# Altium footprint library PcbLib.PcbLib: 35 footprints (part 1 of 3)
Each footprint in its own frame and in the unit in brackets; x right, y up, seen from the top. Pads: shape width x height; smd on the part's side, far side on the other; paste and mask are expansions set on the pad; w line width, h text height; cw(c..) or ccw(c..) is an arc to the next point about the centre after c.
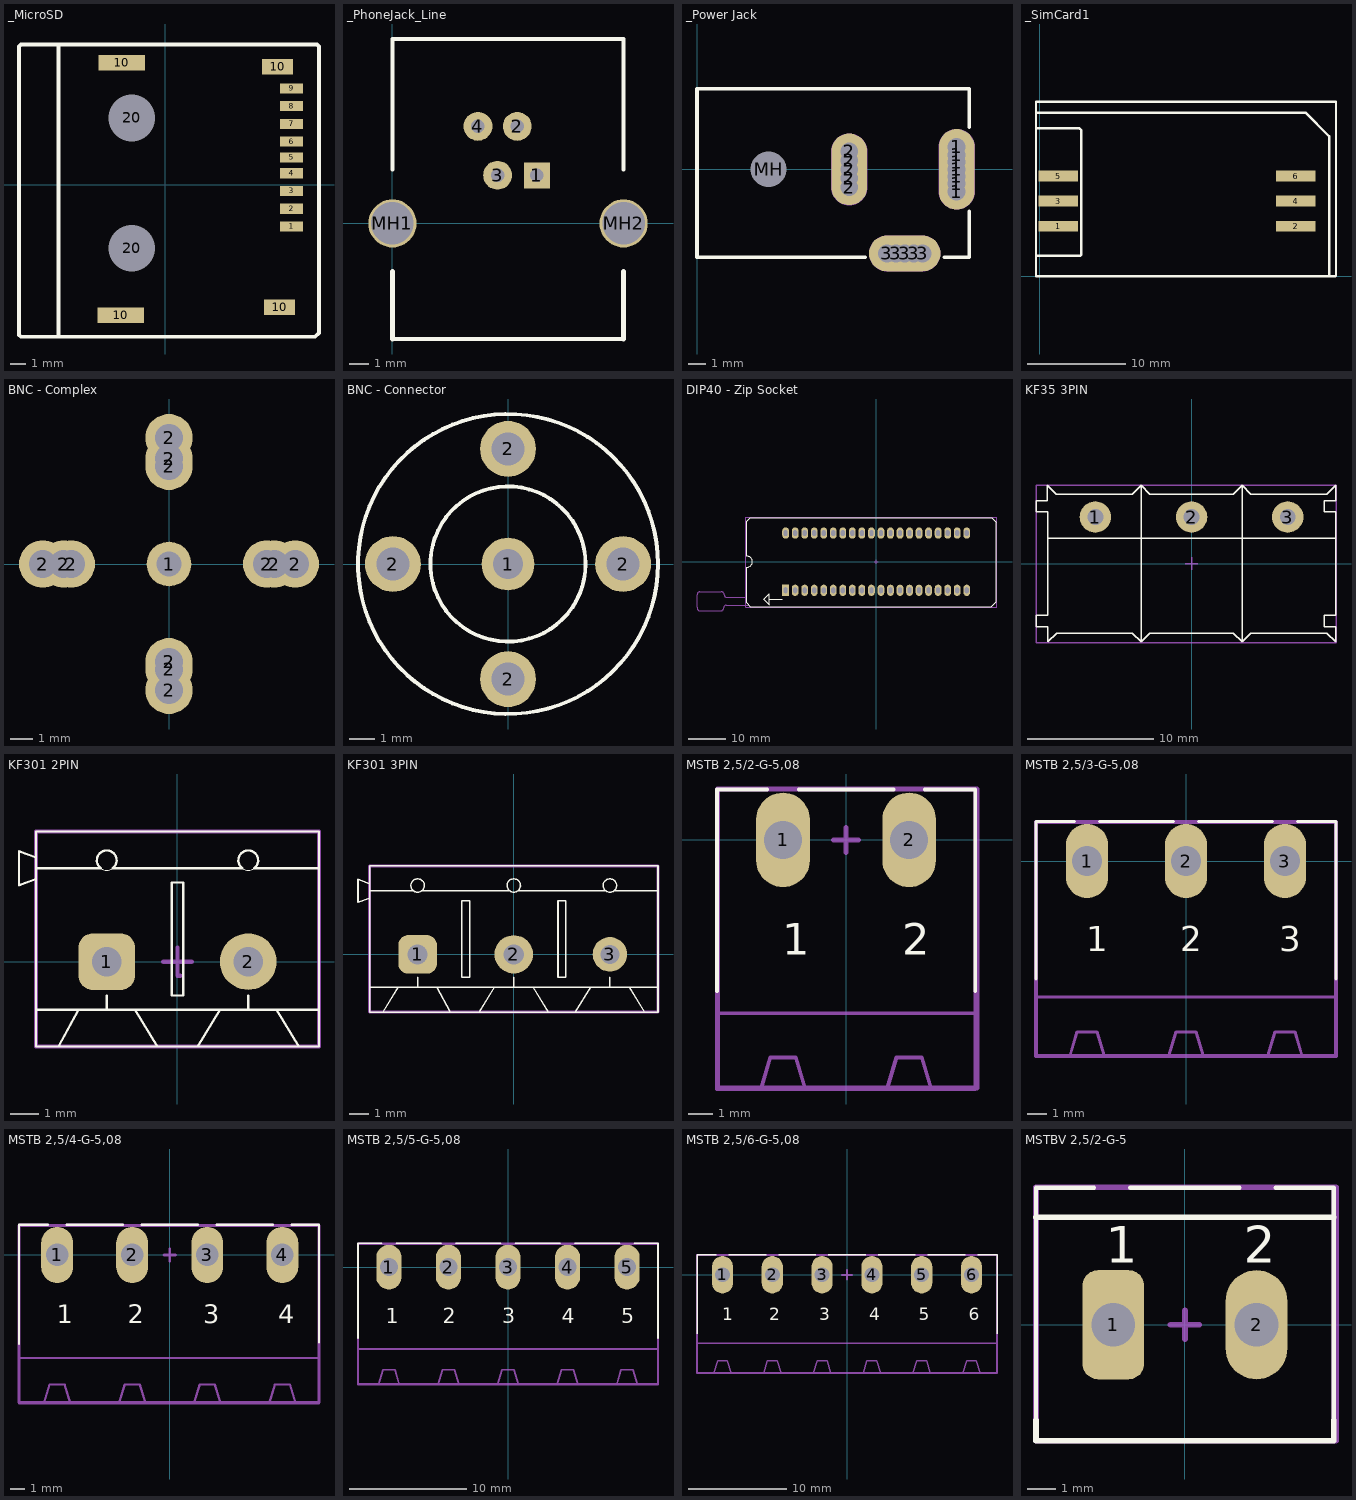
[diagram p0: the footprints below, top view; thin cyan lines are the x and y axes]

## _MicroSD [mm]
pads (15):
  rect 1.5x0.65 smd: 1(8.139,-2.684) 2(8.139,-1.541) 3(8.139,-0.398) 4(8.139,0.745) 5(8.139,1.761) 6(8.139,2.777) 7(8.139,3.92) 8(8.139,5.063) 9(8.139,6.206)
  rect 3x1 smd: 10(-2.846,-8.399) 10(-2.794,7.857)
  rect 2x1 smd: 10(7.239,7.603) 10(7.366,-7.891)
  round 1.524 hole 3: 20(-2.148,-4.081) 20(-2.148,4.301)
Top Overlay:
  lines w0.25: -6.858,-9.779 -6.858,8.89
  lines w0.254: -9.398,-9.652 -9.398,8.89 -9.271,9.017 9.779,9.017 9.906,8.89 9.906,-9.525 9.652,-9.779 9.525,-9.779 -9.271,-9.779 -9.398,-9.652

## _PhoneJack_Line [mm]
pads (6):
  rect 1.35x1.35 hole 0.7: 1(7.5,2.5)
  round 1.5 hole 0.7: 2(6.48,5.04) 3(5.46,2.5) 4(4.44,5.04)
  round 2.5 hole 2.2 unplated: MH1(0,0) MH2(12,0)
Top Overlay:
  lines w0.2: 0,-6 12,-6 ; 0,2.796 0,9.573 12,9.573 12,2.796
  lines w0.25: 0,-6 0,-2.5 ; 12,-6 12,-2.5

## _Power Jack [mm] "Power Adaptor Jack"
pads (18):
  round 1.5 hole 1: 1(14.5,-1.25) 1(14.5,-0.8) 1(14.5,-0.4) 1(14.5,0.4) 1(14.5,0.8) 1(14.5,1.25) 2(8.5,-1) 2(8.5,1) 2(8.5,-0.5) 2(8.5,0.5) 3(10.6,-4.7) 3(11.1,-4.7) 3(12.1,-4.7) 3(12.6,-4.7)
  oval 2x4.5 hole 1: 1(14.5,0)
  oval 2x4 hole 1: 2(8.5,0)
  oval 4x2 hole 1: 3(11.6,-4.7)
  round 1.9 hole 2: MH(4,0)
Top Overlay:
  lines w0.2: 9.4,-4.9 0,-4.9 0,4.5 15.2,4.5 15.2,2.35 ; 13.8,-4.9 15.2,-4.9 15.2,-2.35
Mechanical 1:
  lines w1: 8.5,-1 8.5,1 ; 10.6,-4.7 12.6,-4.7 ; 14.5,-1.25 14.5,1.25
Mechanical 2:
  lines w2.016: 8.5,-1 8.5,1 ; 10.6,-4.7 12.6,-4.7 ; 14.5,-1.25 14.5,1.25

## _SimCard1 [mm]
pads (6):
  rect 4x1.1 smd: 1(1.84,5.08) 2(25.9,5.08) 3(1.84,7.62) 4(25.9,7.62) 5(1.84,10.16) 6(25.9,10.16)
Top Overlay:
  lines w0.25: -0.3,15 2.6,15 4,15 4.2,14.8 4.2,2.2 4.1,2.1 2,2.1 ; -0.3,16.6 26.9,16.6 29.3,14.2 29.3,0 ; -0.2,2.1 2.8,2.1 ; -0.4,0 -0.4,17.7 30,17.7 30,0.1 29.9,0 -0.4,0

## BNC - Complex [mil]
pads (13):
  round 80 hole 45: 1(0,0)
  round 85 hole 50: 2(-226.38,0) 2(-188.98,0) 2(-175.2,0) 2(0,-226.38) 2(0,-188.98) 2(0,-175.2) 2(0,175.2) 2(0,188.98) 2(0,226.38) 2(175.2,0) 2(188.98,0) 2(226.38,0)
3D body "BNC_complex.STEP": height 1369.68, standoff -173.23, extent -278,-278.21 278,278.2

## BNC - Connector [mil]
pads (5):
  round 80 hole 45: 1(0,0)
  round 85 hole 50: 2(-175.2,0) 2(0,-175.2) 2(0,175.2) 2(175.2,0)
Top Overlay:
  circle w5.91: c0,0 r118.11
  circle w5.91: c0,0 r228.35
3D body "My BNC Short.STEP": height 538.19, standoff -173.23, extent -218.11,-218.11 218.11,218.11

## DIP40 - Zip Socket [mm] "40 Pin Zip Socket DESIGNER : ABBAS BASEREH"
height 12
pads (40):
  rect 1.8x3 hole 1 slot 1.5 at 90 deg mask+0.06: 1(-24.13,-7.62)
  oval 1.8x3 hole 1 slot 1.5 at 90 deg mask+0.06: 2(-21.59,-7.62) 3(-19.05,-7.62) 4(-16.51,-7.62) 5(-13.97,-7.62) 6(-11.43,-7.62) 7(-8.89,-7.62) 8(-6.35,-7.62) 9(-3.81,-7.62) 10(-1.27,-7.62) 11(1.27,-7.62) 12(3.81,-7.62) 13(6.35,-7.62) 14(8.89,-7.62) 15(11.43,-7.62) 16(13.97,-7.62) 17(16.51,-7.62) 18(19.05,-7.62) 19(21.59,-7.62) 20(24.13,-7.62) 21(24.13,7.62) 22(21.59,7.62) 23(19.05,7.62) 24(16.51,7.62) 25(13.97,7.62) 26(11.43,7.62) 27(8.89,7.62) 28(6.35,7.62) 29(3.81,7.62) 30(1.27,7.62) 31(-1.27,7.62) 32(-3.81,7.62) 33(-6.35,7.62) 34(-8.89,7.62) 35(-11.43,7.62) 36(-13.97,7.62) 37(-16.51,7.62) 38(-19.05,7.62) 39(-21.59,7.62) 40(-24.13,7.62)
Top Overlay:
  lines w0.2: -28.5,-10 -25,-10 ; -34.5,-10.992 -34.5,-1.5 ccw(c-34.5,0) -34.5,1.5 -34.5,10.778 -33.578,11.7 30.808,11.7 32,10.508 32,-10.722 30.722,-12 -33.492,-12 -34.5,-10.992 ; -30,-10 -28.5,-11.5 -28.5,-8.5 -30,-10
Mechanical 13:
  lines w0.2: -34.5,-9.5 -39.795,-9.5 cw(c-39.795,-8.808) -40.488,-8.808 ccw(c-41.269,-8.808) -41.269,-8.026 -46.965,-8.026 ccw(c-46.965,-8.808) -47.746,-8.808 -47.746,-12.198 ccw(c-46.812,-12.198) -46.812,-13.132 -41.478,-13.132 ccw(c-41.478,-12.243) -40.589,-12.243 cw(c-39.903,-12.243) -39.903,-11.557 -34.135,-11.557
Mechanical 15:
  lines w0.2: -0.5,0 0.5,0 ; 0,-0.5 0,0.5 ; -34.7,-12.2 -34.7,11.9 32.2,11.9 32.2,-12.2 -34.7,-12.2
3D body "Zif-Zip Socket.STEP": height 21.95, standoff -2.53, extent -41.579,-12.975 31.475,11.501

## KF35 3PIN [mm] "Designer Abbas Basereh"
height 12.5
pads (3):
  round 2.5 hole 1.25: 1(-7.62,3.7) 2(0,3.7) 3(7.62,3.7)
Top Overlay:
  lines w0.1: -11.4,2 11.4,2 ; -4,-6.2 -4,6.2 ; -4,-6.2 -3.3,-5.5 3.3,-5.5 4,-6.2 ; -4,-6.2 -4.7,-5.5 -10.7,-5.5 -11.4,-6.2 -11.4,-5 -12.3,-5 -12.3,-4.1 -11.4,-4.1 -11.4,4.1 -11.43,4.1 -12.33,4.1 -12.33,5 -11.43,5 -11.43,6.2 -10.73,5.5 -4.7,5.5 -4,6.2 ; -4,6.2 -3.3,5.5 3.3,5.5 4,6.2 ; 4,-6.2 4,6.2 ; 4,-6.2 4.7,-5.5 10.73,-5.5 11.43,-6.2 11.43,-5 10.53,-5 10.53,-4.1 11.43,-4.1 11.43,4.1 10.53,4.1 10.53,5 11.43,5 11.43,6.2 10.73,5.5 4.7,5.5 4,6.2
Mechanical 15:
  lines w0.1: -0.5,0 0.5,0 ; 0,-0.5 0,0.5 ; -12.3,-6.275 -12.3,6.225 11.45,6.225 11.45,-6.275 -12.3,-6.275

## KF301 2PIN [mm] "Designer Abbas Basereh"
height 7.5
pads (2):
  rrect50% 2x2 hole 1.05: 1(-2.5,0)
  round 2 hole 1.05: 2(2.5,0)
Top Overlay:
  lines w0.013: -2.71,3.3 ccw(c-2.5,3.58) -2.29,3.3 ; 2.29,3.3 ccw(c2.5,3.58) 2.71,3.3
  lines w0.08: -4.2,-3 -3.5,-1.7 -1.5,-1.7 -0.7,-3 ; -2.5,-1.7 -2.5,-1.2 ; 0.7,-3 1.5,-1.7 3.5,-1.7 4.3,-3 ; 2.5,-1.7 2.5,-1.2 ; -5.6,2.7 -5,2.918 ; -5.6,2.7 -5.6,3.9 ; -5.6,2.7 -5,2.918 ; -5.6,2.7 -5.6,3.9 ; -5.6,3.9 -5,3.682 ; -5.6,3.9 -5,3.682 ; -5,-3 -5,-1.7 ; -5,-3 5,-3 ; -5,-3 5,-3 ; -5,-3 -5,2.918 ; -5,-1.7 -5,3.3 ; -5,-1.7 5,-1.7 ; -5,3.3 -5,4.6 ; -5,3.3 -2.71,3.3 cw(c-2.5,3.58) -2.29,3.3 2.29,3.3 cw(c2.5,3.58) 2.71,3.3 5,3.3 ; -5,3.682 -5,4.6 ; -5,4.6 5,4.6 ; -5,4.6 5,4.6 ; 5,-3 5,-1.7 ; 5,-3 5,4.6 ; 5,-1.7 5,3.3 ; 5,3.3 5,4.6 ; -0.2,-1.2 -0.2,2.8 0.2,2.8 0.2,-1.2 -0.2,-1.2
Mechanical 15:
  lines w0.15: -0.5,0 0.5,0 ; 0,0.5 0,-0.5 0.1,-0.5 ; -5,-3 5,-3 5,4.6 -5,4.6 -5,-3
3D body "User Library-Terminal-Screw-3A-2way.STEP": height 10, standoff -3, extent -5.6,-3 5,4.6

## KF301 3PIN [mm] "Designer Abbas Basereh"
height 7.5
pads (3):
  rrect50% 2x2 hole 1.05: 1(-5,0)
  round 2 hole 1.05: 2(0,0)
  round 1.8 hole 1: 3(5,0)
Top Overlay:
  lines w0.08: -6.8,-3 -6,-1.7 -4,-1.7 -3.3,-3 ; -5,-1.7 -5,-1.2 ; -1.8,-3 -1,-1.7 1,-1.7 1.8,-3 ; 0,-1.7 0,-1.2 ; 3.2,-3 4,-1.7 6,-1.7 6.8,-3 ; 5,-1.7 5,-1.2 ; -8.1,2.7 -7.5,2.918 ; -8.1,2.7 -8.1,3.9 ; -8.1,2.7 -8.1,3.9 ; -8.1,2.7 -7.5,2.918 ; -8.1,3.9 -7.5,3.681 ; -8.1,3.9 -7.5,3.681 ; -7.5,-3 7.5,-3 ; -7.5,-3 -7.5,2.918 ; -7.5,-3 7.5,-3 ; -7.5,-3 -7.5,-1.7 ; -7.5,-1.7 7.5,-1.7 ; -7.5,-1.7 -7.5,3.3 ; -7.5,3.3 -5.21,3.3 ; -7.5,3.3 -7.5,4.6 ; -7.5,3.681 -7.5,4.6 ; -7.5,4.6 7.5,4.6 ; -7.5,4.6 7.5,4.6 ; -5.21,3.3 cw(c-5,3.58) -4.79,3.3 ; -5.21,3.3 ccw(c-5,3.58) -4.79,3.3 ; -4.79,3.3 -0.21,3.3 ; -0.21,3.3 cw(c0,3.58) 0.21,3.3 ; -0.21,3.3 ccw(c0,3.58) 0.21,3.3 ; 0.21,3.3 4.79,3.3 ; 4.79,3.3 cw(c5,3.58) 5.21,3.3 ; 4.79,3.3 ccw(c5,3.58) 5.21,3.3 ; 5.21,3.3 7.5,3.3 ; 7.5,-3 7.5,4.6 ; 7.5,-3 7.5,-1.7 ; 7.5,-1.7 7.5,3.3 ; 7.5,3.3 7.5,4.6 ; -2.7,-1.2 -2.7,2.8 -2.3,2.8 -2.3,-1.2 -2.7,-1.2 ; 2.3,-1.2 2.7,-1.2 2.7,2.8 2.3,2.8 2.3,-1.2
Mechanical 15:
  lines w0.15: -7.5,-3 -7.5,4.6 7.5,4.6 7.5,-3 -7.5,-3
3D body "User Library-Terminal-Screw-3A-3way.STEP": height 10, standoff -3, extent -8.1,-3 7.5,4.6

## MSTB 2,5/2-G-5,08 [mil] "Header, Nominal current: 12 A Rated voltage (III/2): 320 V Number of positions: 2 Pitch: 5.08 mm Color: green Contact surface: Tin Assembly: Soldering DESIGNER:ABBAS BASEREH"
height 338.58
pads (2):
  oval 85x150 hole 60: 1(-100,0) 2(100,0)
Top Overlay:
  lines w6: -204.72,-239.72 -204.72,80 -125,80 ; -75,80 75,80 ; 125,80 204.72,80 204.72,-239.72
  text "2" at 88.74,-182.48 h50
  text "1" at -101.26,-182.48 h50
Mechanical 13:
  lines w6: -204.72,-275 204.72,-275 ; -125,80 -204.72,80 -204.72,-239.72 -204.72,-395 -135,-395 ; -75,80 75,80 ; 125,80 204.72,80 204.72,-239.72 204.72,-395 135,-395 ; -135,-395 -65,-395 ; -135,-395 -120,-345 -80,-345 -65,-395 ; -65,-395 65,-395 ; 65,-395 135,-395 ; 65,-395 80,-345 120,-345 135,-395
Mechanical 15:
  lines w7.87: -19.68,0 19.68,0 ; 0,-19.68 0,19.68 ; -203.74,-393.7 -203.74,80.71 207.68,80.71 207.68,-393.7 -203.74,-393.7
3D body "User Library-MSTB 2,5-2-G-5,08 1770711.STEP": height 339.58, standoff -136.8, extent -199.21,-393.75 200.79,78.79

## MSTB 2,5/3-G-5,08 [mil] "Header, Nominal current: 12 A Rated voltage (III/2): 320 V Number of positions: 3 Pitch: 5.08 mm Color: green Contact surface: Tin Assembly: Soldering  DESIGNER:ABBAS BASEREH"
height 338.58
pads (3):
  oval 85x150 hole 60: 1(-200,0) 2(0,0) 3(200,0)
Top Overlay:
  lines w6: -303.15,-238.15 -303.15,80 -225,80 ; -175,80 -25,80 ; 25,80 175,80 ; 225,80 303.15,80 303.15,-238.15
  text "1" at -201.26,-182.48 h50
  text "2" at -11.26,-182.48 h50
  text "3" at 188.74,-182.48 h50
Mechanical 13:
  lines w6: -303.15,-275 303.15,-275 ; -225,80 -303.15,80 -303.15,-238.15 -303.15,-395 -235,-395 ; -175,80 -25,80 ; 25,80 175,80 ; 225,80 303.15,80 303.15,-238.15 303.15,-395 235,-395 ; -235,-395 -220,-345 -180,-345 -165,-395 ; -235,-395 -165,-395 ; -165,-395 -35,-395 ; -35,-395 -20,-345 20,-345 35,-395 ; -35,-395 35,-395 ; 35,-395 165,-395 ; 165,-395 235,-395 ; 165,-395 180,-345 220,-345 235,-395
Mechanical 15:
  lines w7.87: -303.15,-393.7 -303.15,78.74 303.15,78.74 303.15,-393.7 -303.15,-393.7
3D body "User Library-MSTB 2,5-3-G-5,08 1759020.STEP": height 339.58, standoff -136.8, extent -300,-393.79 300,78.74

## MSTB 2,5/4-G-5,08 [mil] "Header, Nominal current: 12 A Rated voltage (III/2): 320 V Number of positions: 4 Pitch: 5,08 mm Color: green Contact surface: Tin Assembly: Soldering  DESIGNER ABBAS BASEREH"
height 338.58
pads (4):
  oval 85x150 hole 60: 1(-300,0) 2(-100,0) 3(100,0) 4(300,0)
Top Overlay:
  lines w6: -401.57,-236.57 -401.57,80 -325,80 ; -275,80 -125,80 ; -75,80 75,80 ; 125,80 275,80 ; 325,80 397.64,80 397.64,-232.64
  text "4" at 288.74,-182.48 h50
  text "3" at 88.74,-182.48 h50
  text "2" at -111.26,-182.48 h50
  text "1" at -301.26,-182.48 h50
Mechanical 13:
  lines w6: -397.64,-275 397.64,-275 ; -325,80 -401.57,80 -401.57,-236.57 -401.57,-395 -335,-395 ; -275,80 -125,80 ; -75,80 75,80 ; 125,80 275,80 ; 325,80 397.64,80 397.64,-232.64 397.64,-395 335,-395 ; -335,-395 -265,-395 ; -335,-395 -320,-345 -280,-345 -265,-395 ; -265,-395 -135,-395 ; -135,-395 -65,-395 ; -135,-395 -120,-345 -80,-345 -65,-395 ; -65,-395 65,-395 ; 65,-395 80,-345 120,-345 135,-395 ; 65,-395 135,-395 ; 135,-395 265,-395 ; 265,-395 280,-345 320,-345 335,-395 ; 265,-395 335,-395
Mechanical 15:
  lines w7.87: -15.75,0 15.75,0 ; 0,-15.75 0,15.75 ; -401.57,-393.7 397.64,-393.7 397.64,78.74 -401.57,78.74 -401.57,-393.7
3D body "User Library-MSTB 2,5-4-G-5,08 1759033.STEP": height 338.58, standoff -137.8, extent -400,-393.79 400,78.74

## MSTB 2,5/5-G-5,08 [mil] "Header, Nominal current: 12 A Rated voltage (III/2): 320 V Number of positions: 5 Pitch: 5,08 mm Color: green Contact surface: Tin Assembly: Soldering  DESIGNER ABBAS BASEREH"
height 338.58
pads (5):
  oval 85x150 hole 60: 1(-400,0) 2(-200,0) 3(0,0) 4(200,0) 5(400,0)
Top Overlay:
  lines w6: -503.94,-238.94 -503.94,80 -425,80 ; -375,80 -225,80 ; -175,80 -25,80 ; 25,80 175,80 ; 225,80 375,80 ; 425,80 503.94,80 503.94,-238.94
  text "1" at -410,-189.37 h50
  text "2" at -220,-189.37 h50
  text "3" at -20,-189.37 h50
  text "4" at 180,-189.37 h50
  text "5" at 380,-189.37 h50
Mechanical 13:
  lines w6: -503.94,-275 503.94,-275 ; -425,80 -503.94,80 -503.94,-238.94 -503.94,-395 -435,-395 ; -375,80 -225,80 ; -175,80 -25,80 ; 25,80 175,80 ; 225,80 375,80 ; 425,80 503.94,80 503.94,-238.94 503.94,-395 435,-395 ; -435,-395 -365,-395 ; -435,-395 -420,-345 -380,-345 -365,-395 ; -365,-395 -235,-395 ; -235,-395 -165,-395 ; -235,-395 -220,-345 -180,-345 -165,-395 ; -165,-395 -35,-395 ; -35,-395 -20,-345 20,-345 35,-395 ; -35,-395 35,-395 ; 35,-395 165,-395 ; 165,-395 180,-345 220,-345 235,-395 ; 165,-395 235,-395 ; 235,-395 365,-395 ; 365,-395 380,-345 420,-345 435,-395 ; 365,-395 435,-395
Mechanical 15:
  lines w7.87: -503.94,-393.7 -503.94,78.74 503.94,78.74 503.94,-393.7 -503.94,-393.7
3D body "User Library-MSTB 2,5-5-G-5,08 1759046.STEP": height 338.58, standoff -137.8, extent -500,-393.79 500,78.74

## MSTB 2,5/6-G-5,08 [mil] "Header, Nominal current: 12 A Rated voltage (III/2): 320 V Number of positions: 6 Pitch: 5,08 mm Color: green Contact surface: Tin Assembly: Soldering  DESIGNER ABBAS BASEREH"
height 338.58
pads (6):
  oval 85x150 hole 60: 1(-500,0) 2(-300,0) 3(-100,0) 4(100,0) 5(300,0) 6(500,0)
Top Overlay:
  lines w6: -602.36,-237.36 -602.36,80 -525,80 ; -475,80 -325,80 ; -275,80 -125,80 ; -75,80 75,80 ; 125,80 275,80 ; 325,80 475,80 ; 525,80 602.36,80 602.36,-237.36
  text "6" at 488.74,-182.48 h50
  text "5" at 288.74,-182.48 h50
  text "4" at 88.74,-182.48 h50
  text "3" at -111.26,-182.48 h50
  text "2" at -311.26,-182.48 h50
  text "1" at -501.26,-182.48 h50
Mechanical 13:
  lines w6: -602.36,-275 602.36,-275 ; -525,80 -602.36,80 -602.36,-237.36 -602.36,-395 -535,-395 ; -475,80 -325,80 ; -275,80 -125,80 ; -75,80 75,80 ; 125,80 275,80 ; 325,80 475,80 ; 525,80 602.36,80 602.36,-237.36 602.36,-395 535,-395 ; -535,-395 -465,-395 ; -535,-395 -520,-345 -480,-345 -465,-395 ; -465,-395 -335,-395 ; -335,-395 -265,-395 ; -335,-395 -320,-345 -280,-345 -265,-395 ; -265,-395 -135,-395 ; -135,-395 -120,-345 -80,-345 -65,-395 ; -135,-395 -65,-395 ; -65,-395 65,-395 ; 65,-395 80,-345 120,-345 135,-395 ; 65,-395 135,-395 ; 135,-395 265,-395 ; 265,-395 280,-345 320,-345 335,-395 ; 265,-395 335,-395 ; 335,-395 465,-395 ; 465,-395 480,-345 520,-345 535,-395 ; 465,-395 535,-395
Mechanical 15:
  lines w7.87: -19.68,0 19.68,0 ; 0,-19.68 0,19.68 ; -602.36,-393.7 602.36,-393.7 602.36,78.74 -602.36,78.74 -602.36,-393.7
3D body "User Library-MSTB 2,5-6-G-5,08 1759059.STEP": height 338.58, standoff -137.8, extent -600,-393.79 600,78.74

## MSTBV 2,5/2-G-5 [mil] "Header, Nominal current: 12 A Rated voltage (III/2): 320 V Number of positions: 2 Pitch: 5mm Color: green Contact surface: Tin Assembly: Soldering DESIGNER:ABBAS BASEREH"
height 338.58
pads (2):
  rrect50% 85x150 hole 60: 1(-98.43,0)
  oval 85x150 hole 60: 2(98.43,0)
Top Overlay:
  lines w6: -204.72,-131.46 -204.72,188.27 -125,188.27 ; -75,188.27 75,188.27 ; 125,188.27 204.72,188.27 204.72,-131.46
  lines w7.87: -204.72,-131.46 -204.72,-159.45 204.72,-159.45 204.72,-131.46 ; -204.72,147.64 204.72,147.64
  text "2" at 80.87,85.24 h50
  text "1" at -109.13,85.24 h50
Mechanical 13:
  lines w6: -204.72,-131.46 -204.72,188.27 -125,188.27 ; -75,188.27 75,188.27 ; 125,188.27 204.72,188.27 204.72,-131.46
Mechanical 15:
  lines w7.87: -19.68,0 19.68,0 ; 0,-19.68 0,19.69 ; -204.72,-159.45 -204.72,188.98 -203.74,188.98 207.68,188.98 207.68,-159.45 -204.72,-159.45
3D body "1753437.stEp": height 473.44, standoff -152.54, extent -196.85,-151.57 196.85,187.01